# Altium integrated library Silica_IntLib.IntLib: 305 symbols (part 1 of 3) (continued)
## CI REG MCP16252 BOOST ADJ 100MA SOT23-6
designator U?, comment MCP16252T-I/CH
Switching Voltage Regulators; Manufacturer: Microchip; Manufacturer Part Number: MCP16252T-I/CH; Supplier 1: Mouser; Supplier Part Number 1: 579-MCP16252T-I/CH; Supplier Link 1: https://www.mouser.at/ProductDetail/Microchip-Technology/MCP16252T-I-CH?qs=sGAEpiMZZMtitjHzVIkrqbD93URdM9jft7YEhtTu2Rc%3d
footprint SOT23-6
pins: 1 SW, 2 GND, 3 EN, 4 VFB, 5 VOUT, 6 VIN

## CI REG MCP73831T-2ATI/OT SOT23-5
designator U?, comment MCP73831T-2ATI
Charger IC Lithium-Ion/Polymer SOT-23-5; VALUE: MCP73831T-2ATI/OT; Supplier 1: Digi-Key; Supplier 2: Farnell; Supplier 3: Digi-Key; Supplier 4: Allied; Supplier 5: Farnell; Supplier 6: Newark; Supplier 7: Newark; Supplier 8: Farnell; Supplier 9: Newark; Supplier 10: Farnell; Supplier 11: Digi-Key; Supplier Part Number 1: MCP73831T-2ATI/OTTR-ND; Supplier Part Number 2: 2413496; Supplier Part Number 3: MCP73831T-2ATI/OTCT-ND; Supplier Part Number 4: 70388655; Supplier Part Number 5: 1834890RL; Supplier Part Number 6: 84R5196; Supplier Part Number 7: 84R8632; Supplier Part Number 8: 2146142; Supplier Part Number 9: 56K7047; Supplier Part Number 10: 1834890; Supplier Part Number 11: MCP73831T-2ATI/OTDKR-ND
footprint SOT23-5
pins: 1 STAT, 2 GND, 3 VBAT, 4 VDD, 5 PROG

## CI REG NCP1117ST33T3G SOT223
designator U?, comment NCP1117ST33T3G
Linear Voltage Regulator IC Positive Fixed 1 Output  1A SOT-223; Manufacturer 1: ON Semiconductor; Supplier 1: Mouser; Supplier 2: Digi-Key; Supplier 3: Digi-Key; Supplier Part Number 1: 863-NCP1117ST33T3G; Supplier Part Number 2: NCP1117ST33T3GOSCT-ND; Supplier Part Number 3: NCP1117ST33T3GOSDKR-ND; VALUE: NCP1117ST33T3G; Manufacturer Part Number 1: NCP1117ST33T3G
footprint SOT-223 - 4 (SOT223, 4-Leads, Body 6,7x7,3mm (max), Pitch 2,30mm, IPC High Density)
pins: 1 GND, 2 VOUT, 3 VIN, 4 VOUT

## CI REG SP6203EM5-L-3-3 SOT23-5
designator U?, comment SP6203EM5-L-3-3
Linear Voltage Regulator IC Positive Fixed 1 Output  300mA SOT-23-5; Manufacturer 1: MaxLinear, Inc.; Supplier 1: Digi-Key; Supplier 2: Mouser; Supplier 3: Digi-Key; Supplier Part Number 1: 1016-1205-ND; Supplier Part Number 2: 701-SP6203EM5L33/TR; Supplier Part Number 3: SP6203EM5-L-3-3/TR-ND; Manufacturer Part Number 1: SP6203EM5-L-3-3; VALUE: SP6203EM5-L-3-3
footprint SOT23-5
pins: 1 VIN, 2 GND, 3 EN, 4 BYP, 5 VOUT

## CI REG SP6205EM5-L-3-3 SOT23-5
designator U?, comment SP6205EM5-L-3-3
Linear Voltage Regulator IC Positive Fixed 1 Output  500mA SOT-23-5; Manufacturer 1: MaxLinear, Inc.; Manufacturer Part Number 1: SP6205EM5-L-3-3/TR; Supplier 1: Mouser; Supplier 2: Mouser; Supplier 3: Digi-Key; Supplier Part Number 1: 701-SP6205EM5L33/TR; Supplier Part Number 2: 701-SP6205EM5-L-3-3; Supplier Part Number 3: 1016-1208-ND; VALUE: SP6205EM5-L-3-3
footprint SOT23-5
pins: 1 VIN, 2 GND, 3 EN, 4 BYP, 5 VOUT

## CI SN65HVD1781 SOIC-8
designator U?, comment SN65HVD1781
1/1 Transceiver Half RS422, RS485 8-SOIC; Manufacturer 1: Texas Instruments; Part Number 1: SN65HVD1781DR; Supplier 1: Farnell; Supplier 2: Newark; Supplier 3: Mouser; Supplier 4: Digi-Key; Supplier Part Number 1: 1703343; Supplier Part Number 2: 85M0100; Supplier Part Number 3: 595-SN65HVD1781DR; Supplier Part Number 4: 296-23118-1-ND; Value: SN65HVD1781
footprint SOIC-8N
pins: 1 R, 2 ~{RE}, 3 DE, 4 D, 5 GND, 6 A, 7 ~{B}, 8 VCC

## CI SN65HVD1785 SOIC-8
designator U?, comment SN65HVD1785
CI SN65HVD1785 SOIC-8; Supplier 1: Farnell; Supplier 2: Mouser; Supplier 3: Newark; Supplier 4: Digi-Key; Supplier 5: Digi-Key; Supplier Part Number 1: 1755057; Supplier Part Number 2: 595-SN65HVD1785DR; Supplier Part Number 3: 94M9570; Supplier Part Number 4: 296-39174-2-ND; Supplier Part Number 5: SN65HVD1785DRG4-ND; Value: SN65HVD1785
footprint SOIC-8N
pins: 1 R, 2 ~{RE}, 3 DE, 4 D, 5 GND, 6 A, 7 ~{B}, 8 VCC

## CI SN74LVC2T45 TSSOP8
designator U?, comment SN74LVC2T45DCTR
Voltage Level Translator Bidirectional 1 Circuit 2 Channel 420Mbps SM8 (SSOP); Manufacturer 1: Texas Instruments; Supplier 1: Farnell; Supplier 2: Digi-Key; Supplier 3: Newark; Supplier 4: Mouser; Supplier Part Number 1: 2412409; Supplier Part Number 2: 296-16845-2-ND; Supplier Part Number 3: 28X3899; Supplier Part Number 4: 595-SN74LVC2T45DCTE4; Part Number 1: SN74LVC2T45DCTR
footprint TSSOP8 (TSSOP, 8-Leads, Body 2.95x2.80mm, Pitch 0.65mm, IPC Medium Density)
pins: 1 VCCA, 2 A1, 3 A2, 4 GND, 5 DIR, 6 B2, 7 B1, 8 VCCB

## CI SST25VF010A-33 SOIC-8
designator U?, comment SST25VF010A
FLASH Memory IC 1Mb (128K x 8) SPI 33MHz  8-SOIC; Manufacturer Part Number 1: SST25VF010A-33-4I-SAE-T; Manufacturer 1: Microchip Technology; Value: SST25VF010A-33-4I-SAE; Supplier 1: Newark; Supplier 2: Farnell; Supplier 3: Digi-Key; Supplier 4: Mouser; Supplier Part Number 1: 54M1121; Supplier Part Number 2: 1829949; Supplier Part Number 3: SST25VF010A-33-4I-SAE-ND; Supplier Part Number 4: 804-25VF010A3ISAE
footprint SOIC-8N
pins: 1 ~{CE}, 2 SO, 3 ~{WP}, 4 VSS, 5 SI, 6 SCK, 7 ~{HOLD}, 8 VDD

## CI SWITCH TS3A4741DCNR DUAL SPST SOT23-8
designator U?, comment TS3A4741DCNR
2 Circuit IC Switch 1:1 900mOhm SOT-23-8; Manufacturer 1: Texas Instruments; VALUE: TS3A4741DCNR; Part Number 1: TS3A4741DCNR
footprint SOT23-8
part A pins: 1 IN, 7 COM, 8 NO
part B pins: 3 NO, 4 COM, 6 IN
part C pins: 2 VCC, 5 GND

## CI VREF SERIES 5V ADR02ARZ 8SOIC
designator U?, comment ADR02ARZ
Series Voltage Reference IC  ±0.1% 10mA 8-SOIC; Part Number 1: ADR02ARZ-REEL7; Manufacturer 1: Analog Devices Inc.; AD: ADR02ARZ
footprint SOIC-8N
pins: 1 NIC, 2 VIN, 3 TEMP, 4 GND, 5 TRIM, 6 VOUT, 7 NIC, 8 NIC

## CMC DLW21SN670HQ2L 320MA 2LN 67 OHM SMD
designator L?, comment DLW21SN670HQ2L
Common Mode Choke Coil Wire Wound Type; Supplier 1: Digi-Key; Supplier 2: Digi-Key; Supplier 3: Digi-Key; Supplier Part Number 1: 490-5133-6-ND; Supplier Part Number 2: 490-5133-1-ND; Supplier Part Number 3: 490-5133-2-ND
footprint SMD_DLW21S (DLW21S Series (0805 Size))
pins: 1, 2, 3, 4

## CMC DLW31SN900SQ2L 370MA 2LN 90 OHM SMD
designator L?, comment DLW31SN900SQ2L
2 Line Common Mode Choke Surface Mount 90 Ohm @ 100MHz 370mA DCR 300 mOhm; Manufacturer 1: Hirose Electric Co Ltd; Manufacturer Part Number 1: U.FL-R-SMT-1(01); Supplier 1: Digi-Key; Supplier 2: Digi-Key; Supplier 3: Digi-Key; Supplier 4: Mouser; Supplier 5: Arrow; Supplier Part Number 5: DLW31SN900SQ2L; Supplier Part Number 4: 81-DLW31SN900SQ2L; Supplier Part Number 3: 490-1067-2-ND; Supplier Part Number 2: 490-1067-6-ND; Supplier Part Number 1: 490-1067-1-ND; Value: DLW31SN900SQ2L
footprint SMD_DLW31S (DLW31S Series)
pins: 1, 2, 3, 4

## CONEC MCV 1,5_3-G-3,5 B
designator J?, comment MCV 1,5/ 3-G-3,5
3 Position Terminal Block Header, Male Pins, Shrouded (4 Side) 0.138" (3.50mm) Vertical  Through Hole; Manufacturer 1: Phoenix Contact; Manufacturer Part Number 1: 1843619; TYPE: MCV 1,5/ 3-G-3,5
footprint MCV 1,5_3-G-3,5
pins: 1, 2, 3

## CONEC MCV 1,5_3-G-3,81 B
designator J?  TYPE: MCV 1,5/ 3-G-3,81  (hidden comment: *)
MANUFACTURER: PHOENIX CONTACT; PN: 1803439; PACKING: B; PACKAGE: MCV 1,5/ 3-G-3,81; Supplier 1: Digi-Key; Supplier Part Number 1: 277-1222-ND
footprint MCV 1,5_3-G-3,81
footprint MCV 1,5_3-G-3,81 THR
pins: 1, 2, 3

## CONEC MCV 1,5_4-G-3,81 B
designator J?  TYPE: MCV 1,5/ 4-G-3,81  (hidden comment: *)
MANUFACTURER: PHOENIX CONTACT; PN: 1803442; PACKING: B; PACKAGE: MCV 1,5/ 4-G-3,81; Supplier 1: Digi-Key; Supplier Part Number 1: 277-1223-ND
footprint MCV 1,5_4-G-3,81
footprint MCV 1,5_4-G-3,81 THR
pins: 1, 2, 3, 4

## CONEC MCV 1,5_6-G-3,5 B
designator J?  TYPE: MCV 1,5/ 6-G-3,5  (hidden comment: *)
MANUFACTURER: PHOENIX CONTACT; PN: 1843648; PACKING: B; PACKAGE: MCV 1,5/ 6-G-3,5; Supplier 1: Mouser; Supplier Part Number 1: 651-1843648
footprint MCV 1,5_6-G-3,5
footprint MCV 1,5_6-G-3,5 THR
pins: 1, 2, 3, 4, 5, 6

## CONEC MCV 1,5_7-G-3,81AU B
designator J?  TYPE: MCV 1,5/ 7-G-3,81AU  (hidden comment: *)
MANUFACTURER: PHOENIX CONTACT; PN: 1939895; PACKING: B; PACKAGE: MCV 1,5/ 7-G-3,81AU
footprint MCV 1,5_7-G-3,81
pins: 1, 2, 3, 4, 5, 6, 7

## CONEC MSTB 2,5_2-G-5,08 B
designator J?  TYPE: MSTB 2,5/2-G-5,08  (hidden comment: *)
MANUFACTURER: PHOENIX CONTACT; PN: 1759017; PACKING: B; PACKAGE: MSTB 2,5/2-G-5,08; Supplier 1: Digi-Key; Supplier Part Number 1: 277-1095-ND
footprint MSTB 2,5_2-G-5,08 (Footprint not found)
pins: 1, 2

## CONEC SFMC-102-01-S-D  .050" X .050 CUTTABLE SKT STRIP
designator J?, comment SFMC-102-01-S-D
4 Position Receptacle Connector  Through Hole; Manufacturer 1: Samtec Inc.; VALUE: SFMC-102-01-S-D; Manufacturer Part Number 1: SFMC-102-01-S-D; Supplier 1: Digi-Key; Supplier 2: Farnell; Supplier 3: Mouser; Supplier 4: Arrow Electronics Inc.; Supplier 5: Newark; Supplier Part Number 1: SAM9900-ND; Supplier Part Number 2: 2779535; Supplier Part Number 3: 200-SFMC10201SD; Supplier Part Number 4: SFMC-102-01-S-D; Supplier Part Number 5: 33AC3092
footprint SFMC-102-01-S-D
pins: 1, 2, 3, 4

## CONECTOR BORNE 2 VIAS (5mm PASSO)
designator J?, comment KRE-2T  (value not drawn)
CONECTOR BORNE 2 VIAS (5mm PASSO); METALTEX: BR02A
footprint BR11 METALTEX
pins: 1, 2

## CONECTOR USB B P/PCI
designator J?, comment USB-BN  (value not drawn)
CONECTOR USB B P/PCI; METALTEX: USB-BN
pins: 1, 2, 3, 4, 5, 6
text: VBUS; D+; D-; SHIELD; GND

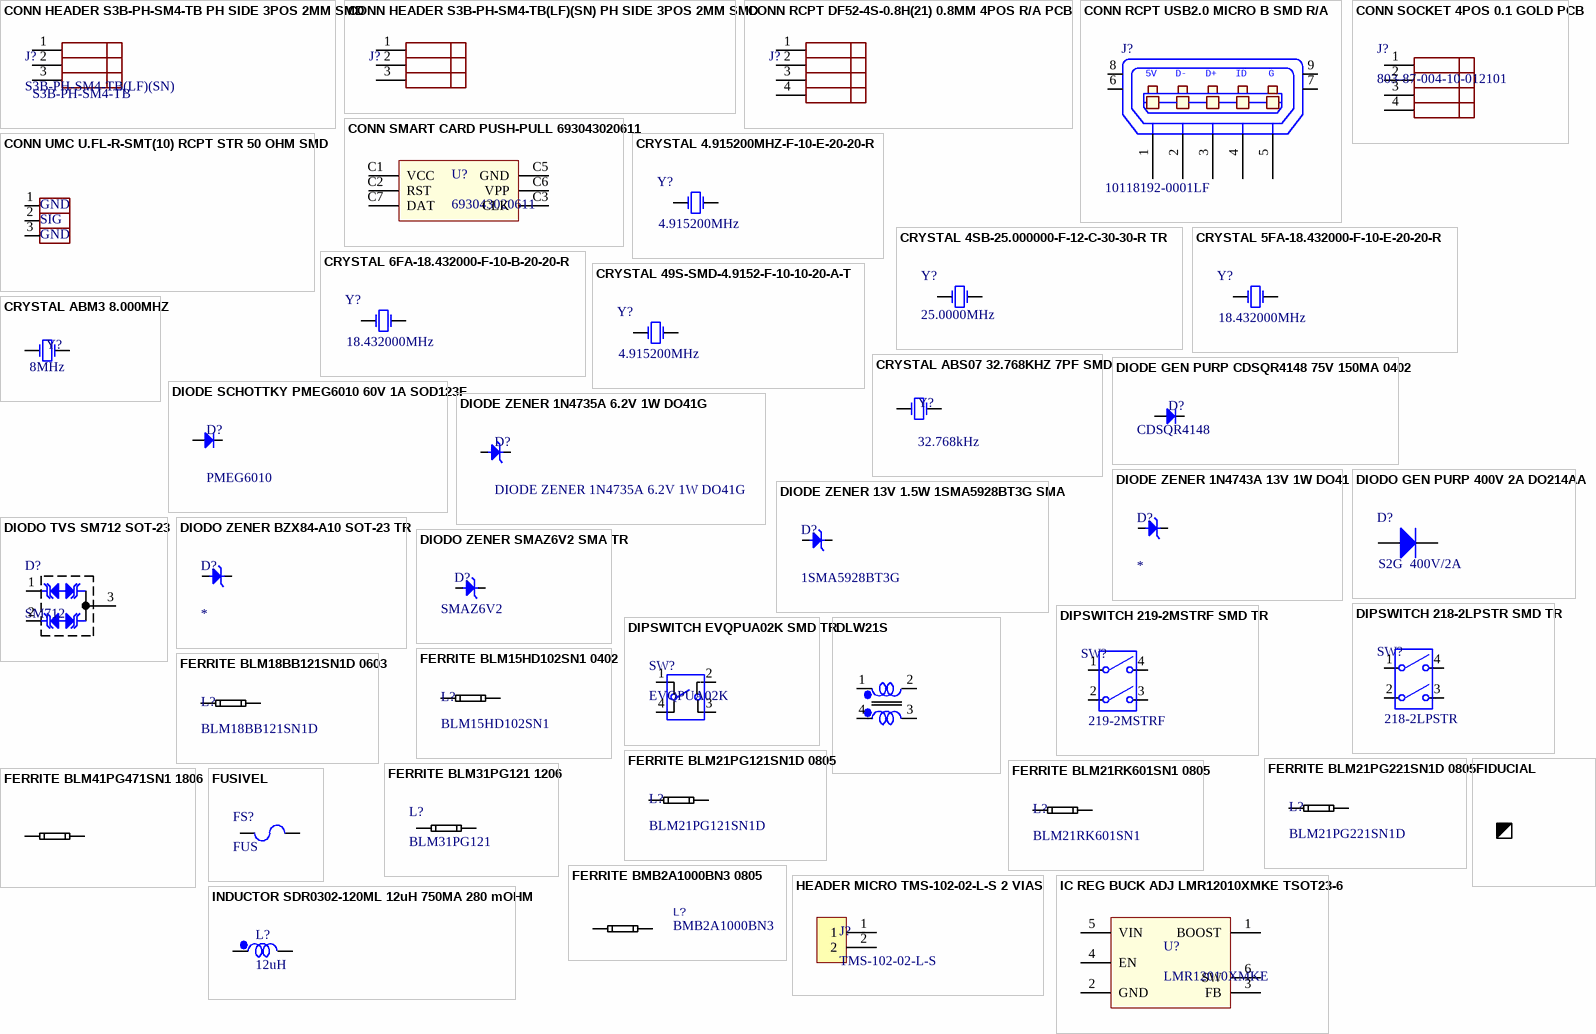
[diagram p3: symbols CONN HEADER S3B-PH-SM4-TB PH SIDE 3POS 2MM SMD to INDUCTOR SDR0302-120ML 12uH 750MA 280 mOHM]

## CONN HEADER S3B-PH-SM4-TB PH SIDE 3POS 2MM SMD
designator J?, comment S3B-PH-SM4-TB(LF)(SN)  value S3B-PH-SM4-TB
4 Position Socket Connector 0.031" (0.80mm) Surface Mount, Right Angle Tin; Supplier 1: Newark; Supplier 2: Farnell; Supplier 3: Digi-Key; Supplier 4: Digi-Key; Supplier 5: Digi-Key; Supplier 6: RSComponents; Supplier 7: RSComponents; Supplier 8: RSComponents; Supplier 9: Allied; Supplier 10: RSComponents; Supplier Part Number 1: 38K8071; Supplier Part Number 2: 9492623; Supplier Part Number 3: 455-1750-2-ND; Supplier Part Number 4: 455-1750-1-ND; Supplier Part Number 5: 455-1750-6-ND; Supplier Part Number 6: 688-1357P; Supplier Part Number 7: 688-1357; Supplier Part Number 8: 6881357; Supplier Part Number 9: R1044573; Supplier Part Number 10: 6881357P
footprint S3B-PH-SM4-TB (3 Positions Header Connector 0.079" (2.00mm) Surface Mount, Right Angle Tin)
pins: 1, 2, 3

## CONN HEADER S3B-PH-SM4-TB(LF)(SN) PH SIDE 3POS 2MM SMD
designator J?, comment S3B-PH-SM4-TB(LF)(SN)  (value not drawn)
Connector Header Surface Mount, Right Angle 3 position 0.079" (2.00mm); Manufacturer 1: JST Sales America Inc.; VALUE: S3B-PH-SM4-TB(LF)(SN); Manufacturer Part Number 1: S3B-PH-SM4-TB(LF)(SN); Supplier 1: Arrow Electronics Inc.; Supplier 2: Digi-Key; Supplier 3: Digi-Key; Supplier Part Number 3: 455-1750-1-ND; Supplier Part Number 2: 455-1750-2-ND; Supplier Part Number 1: S3B-PH-SM4-TB (LF)(SN)
footprint S3B-PH-SM4-TB (3 Positions Header Connector 0.079" (2.00mm) Surface Mount, Right Angle Tin)
pins: 1, 2, 3

## CONN RCPT DF52-4S-0.8H(21) 0.8MM 4POS R/A PCB
designator J?, comment DF52-4S-0.8H(21)  (value not drawn)
4 Position Socket Connector 0.031" (0.80mm) Surface Mount, Right Angle Tin; VALUE: DF52-4S-0.8H(21); Supplier 1: Digi-Key; Supplier 2: Digi-Key; Supplier 3: Digi-Key; Supplier Part Number 1: H125098TR-ND; Supplier Part Number 2: H125098CT-ND; Supplier Part Number 3: H125098DKR-ND
footprint DF52-4S-0.8H(21)
pins: 1, 2, 3, 4

## CONN RCPT USB2.0 MICRO B SMD R/A
designator J?, comment value 10118192-0001LF  (hidden comment: USB2.0 MICRO B)
USB - micro B USB 2.0 Receptacle Connector 5 Position Surface Mount, Right Angle; Manufacturer 1: Amphenol ICC (FCI); Manufacturer Part Number 1: 10118192-0001LF; Supplier 1: Mouser; Supplier Part Number 1: 649-10118192-0001LF
footprint USB_MICRO_AB
pins: 1 P1, 2 P2, 3 P3, 4 P4, 5 P5, 6, 7, 8, 9
text: 5V; D-; D+; ID; G

## CONN SMART CARD PUSH-PULL 693043020611
designator U?, comment 693043020611
6 Position Card Connector NANO SIM Surface Mount, Right Angle Gold; Manufacturer 1: Wurth Electronics Inc.; VALUE: 693043020611; Supplier 1: Farnell; Supplier 2: Newark; Supplier 3: Digi-Key; Supplier 4: Digi-Key; Supplier 5: Digi-Key; Supplier 6: Farnell; Supplier 7: Newark; Supplier Part Number 1: 2470827; Supplier Part Number 2: 46Y2832; Supplier Part Number 3: 732-5954-2-ND; Supplier Part Number 4: 732-5954-1-ND; Supplier Part Number 5: 732-5954-6-ND; Supplier Part Number 6: 2470836; Supplier Part Number 7: 52Y1273; Manufacturer Part Number 1: 693043020611
footprint 693043020611 (NANO SIM - PUSH & PULL TYPE - 6 PINS)
pins: C1 VCC, C2 RST, C3 CLK, C5 GND, C6 VPP, C7 DAT

## CONN SOCKET 4POS 0.1 GOLD PCB
designator J?, comment 803-87-004-10-012101
4 Position Socket Connector 0.100" (2.54mm) Through Hole Gold; Manufacturer 1: Preci-Dip; VALUE: 803-87-004-10-012101; Manufacturer Part Number 1: 803-87-004-10-012101
footprint 803-87-004-10-012101
pins: 1, 2, 3, 4

## CONN UMC U.FL-R-SMT(10) RCPT STR 50 OHM SMD
designator J?, comment U.FL-R-SMT(10)  Supplier Part Number 1: H122041-ND  Supplier Part Number 2: 798-UFLRSMT101
U.FL (UMCC) Connector Receptacle, Male Pin 50 Ohm Surface Mount Solder; Manufacturer 1: Hirose Electric Co Ltd; Manufacturer Part Number 1: U.FL-R-SMT-1(01); Value: U.FL-R-SMT-1(01); Supplier 1: Digi-Key; Supplier 2: Mouser
footprint U.FL-R-SMT
pins: 1 GND, 2 SIG, 3 GND

## CRYSTAL 4.915200MHZ-F-10-E-20-20-R
designator Y?  value 4.915200MHz  (hidden comment: CRYSTAL 4.915200MHZ-F-10-E-20-20-R)
MANUFACTURER: HOSONIC; ERPCODE: 0018369; PACKING: TR; PN: SB-4.915200-F-10-E-20-20-R; PACKAGE: SMD; TYPE: Cristal SMD
footprint HC-49SMA (SURFACE MOUNT CRYSTAL)
pins: 1 OSC1, 2 OSC2

## CRYSTAL 4SB-25.000000-F-12-C-30-30-R TR
designator Y?, comment 25.0000MHz
CRISTAL 4SB-25.000000-F-12-C-30-30-R TR
footprint HCX-4SB (Cristal de Quartzo em SMD)
pins: 1 OSC1, 3 OSC2

## CRYSTAL 5FA-18.432000-F-10-E-20-20-R
designator Y?  value 18.432000MHz  (hidden comment: CRYSTAL 5FA-18.432000-F-10-E-20-20-R)
MANUFACTURER: SHOULDER; ERPCODE: 0023370; PACKING: TR; PACKAGE: SMD; TYPE: Cristal SMD; PN: 5FA-18.432000-F-10-E-20-20-R
footprint HCX-5FA (SURFACE MOUNT CRYSTAL)
pins: 1 OSC1, 2 OSC2

## CRYSTAL 6FA-18.432000-F-10-B-20-20-R
designator Y?  value 18.432000MHz  (hidden comment: CRYSTAL 6FA-18.432000-F-10-B-20-20-R)
MANUFACTURER: HOSONIC; ERPCODE: 0018367; PACKING: TR; PACKAGE: SMD; TYPE: Cristal SMD; PN: 6FA-18.432000-F-10-B-20-20-R
footprint HCX-6FA (SURFACE MOUNT CRYSTAL)
pins: 1 OSC1, 2 OSC2

## CRYSTAL 49S-SMD-4.9152-F-10-10-20-A-T
designator Y?  value 4.915200MHz  (hidden comment: CRYSTAL 49S-SMD-4.9152-F-10-10-20-A-T)
MANUFACTURER: SHOULDER; ERPCODE: 0032009; PACKING: TR; PACKAGE: SMD; TYPE: Cristal SMD; PN: 49S-SMD-4.9152-F-10-10-20-A-T
footprint HC-49SB (LOW PROFILE HOLDER TYPE CRYSTAL UNITS)
pins: 1 OSC1, 2 OSC2

## CRYSTAL ABM3 8.000MHZ
designator Y?, comment 8MHz
8MHz ±20ppm Crystal 18pF 140 Ohm -40°C ~ 85°C Surface Mount 2-SMD, No Lead; Manufacturer 1: Abracon LLC; Manufacturer Part Number 1: ABM3-8.000MHZ-D2Y-T; Supplier 1: Digi-Key; Supplier 2: Farnell; Supplier 3: Farnell; Supplier 4: Digi-Key; Supplier 5: Newark; Supplier 6: Farnell; Supplier 7: Newark; Supplier 8: Digi-Key; Supplier 9: Farnell; Supplier 10: Newark; Supplier Part Number 1: 535-10630-2-ND; Supplier Part Number 2: 2367927; Supplier Part Number 3: 2101329RL; Supplier Part Number 4: 535-10630-1-ND; Supplier Part Number 5: 06X4672; Supplier Part Number 6: 2101329; Supplier Part Number 7: 76R7536; Supplier Part Number 8: 535-10630-6-ND; Supplier Part Number 9: 2101337; Supplier Part Number 10: 77R1485; VALUE: 8MHz
footprint ABM3 (MINIATURE CERAMIC SMD CRYSTAL)
pins: 1 OSC1, 2 OSC2

## CRYSTAL ABS07 32.768KHZ 7PF SMD
designator Y?, comment 32.768kHz
32.768kHz ±20ppm Crystal 7pF 70 kOhms 2-SMD, No Lead; Manufacturer 1: Abracon LLC; Manufacturer Part Number 1: ABS07-32.768KHZ-7-T; VALUE: 32.768kHz; Supplier 1: Digi-Key; Supplier 2: Digi-Key; Supplier 3: Digi-Key; Supplier 4: Future Electronics; Supplier 5: Future Electronics; Supplier 6: Farnell; Supplier 7: Farnell; Supplier 8: Mouser; Supplier 9: Avnet; Supplier 10: Arrow; Supplier 11: RSComponents; Supplier 12: RSComponents; Supplier 13: Avnet; Supplier 14: Avnet; Supplier 15: Newark; Supplier 16: Newark; Supplier 17: Newark; Supplier 18: Allied Electronics; Supplier 19: Arrow; Supplier 20: Avnet; Supplier 21: Avnet; Supplier 22: Farnell; Supplier 23: Future Electronics; Supplier 24: Future Electronics; Supplier 25: Future Electronics; Supplier Part Number 1: 535-9543-1-ND; Supplier Part Number 10: ABS07-32.768KHZ-7-T; Supplier Part Number 11: 1712773; Supplier Part Number 12: 1712307; Supplier Part Number 13: 14N8750; Supplier Part Number 14: 89M4970; Supplier Part Number 15: 14N8750; Supplier Part Number 16: 89M4970; Supplier Part Number 17: 25AC5632; Supplier Part Number 18: 71528070; Supplier Part Number 19: ABS07-32.768KHZ-7-T**MULT; Supplier Part Number 2: 535-9543-6-ND; Supplier Part Number 20: ABS07-32.768>>>; Supplier Part Number 21: ABS07-32.768KHZ-7-T/BKN; Supplier Part Number 22: 1838935RL; Supplier Part Number 23: ABS07-32.768KHZ-7-T; Supplier Part Number 9: ABS07-32.768KHZ-7-T; Supplier Part Number 8: 815-ABS07-32.768K7T; Supplier Part Number 7: 1833022; Supplier Part Number 6: 1838935; Supplier Part Number 5: ABS07-32.768KHZ-7-T-CUTT; Supplier Part Number 4: ABS07-32.768KHZ-7-T-REEL; Supplier Part Number 3: 535-9543-2-ND; Supplier Part Number 25: 6065130; Supplier Part Number 24: 8133308
footprint ABS07 (MINIATURE CERAMIC SMD CRYSTAL)
pins: 1 OSC1, 2 OSC2

## DIODE GEN PURP CDSQR4148 75V 150MA 0402
designator D?, comment CDSQR4148
Diode Standard 75V 150mA Surface Mount 0402/SOD-923F; Manufacturer 1: Comchip Technology; Manufacturer Part Number 1: CDSQR4148; Supplier 1: Digi-Key; Supplier 2: Digi-Key; Supplier 3: Digi-Key; Supplier 4: Mouser; Supplier 5: Arrow Electronics Inc.; Supplier 6: Allied Electronics; Supplier Part Number 6: 70426693; Supplier Part Number 5: CDSQR4148; Supplier Part Number 4: 750-CDSQR4148; Supplier Part Number 3: 641-1287-2-ND; Supplier Part Number 2: 641-1287-6-ND; Supplier Part Number 1: 641-1287-1-ND; VALUE: CDSQR4148
footprint SOD-923F
pins: 1 A, 2 K

## DIODE SCHOTTKY PMEG6010 60V 1A SOD123F
designator D?, comment PMEG6010
Diode Schottky 60V 1A (DC) Surface Mount SOD-123F; Manufacturer 1: Nexperia USA Inc.; Part Number 1: PMEG6010CEH,115; VALUE: PMEG6010
footprint SOD123F
pins: 1 A, 2 K

## DIODE ZENER 1N4735A 6.2V 1W DO41G
designator D?
Diodo Zener 6,2V / 1W; FARCHILD: 1N4735A; Supplier 1: Newark; Supplier 2: Digi-Key; Supplier 3: Allied; Supplier 4: Digi-Key; Supplier 5: Newark; Supplier 6: Farnell; Supplier 7: Newark; Supplier 8: Allied; Supplier 9: Farnell; Supplier 10: Digi-Key; Supplier 11: Farnell; Supplier 12: Farnell; Supplier 13: Farnell; Supplier 14: Newark; Supplier 15: Newark; Supplier 16: Farnell; Supplier 17: Digi-Key; Supplier 18: Digi-Key; Supplier 19: Digi-Key; Supplier 20: Digi-Key; Supplier 21: Farnell; Supplier 22: Newark; Supplier 23: Newark; Supplier 24: Newark; Supplier 25: Farnell; Supplier 26: Digi-Key; Supplier 27: Newark; Supplier 28: Newark; Supplier 29: Farnell; Supplier 30: Digi-Key; Supplier 31: Farnell; Supplier 32: Digi-Key; Supplier Part Number 1: 06M7371; Supplier Part Number 2: 1N4735A-TPTR-ND; Supplier Part Number 3: 70061975; Supplier Part Number 4: 1N4735AVSTR-ND; Supplier Part Number 5: 75R5240; Supplier Part Number 6: 1612364; Supplier Part Number 7: 18C8951; Supplier Part Number 8: 70061609; Supplier Part Number 9: 1504412; Supplier Part Number 10: 1N4735AVSCT-ND; Supplier Part Number 11: 2453286; Supplier Part Number 12: 4398786; Supplier Part Number 13: 1861449RL; Supplier Part Number 14: 95B4975; Supplier Part Number 15: 90R9422; Supplier Part Number 16: 2371129; Supplier Part Number 17: 1N4735AFS-ND; Supplier Part Number 18: 1N4735A_T50AFSCT-ND; Supplier Part Number 19: 1N4735A_T50AFSTB-ND; Supplier Part Number 20: 1727-4226-2-ND; Supplier Part Number 21: 1861449; Supplier Part Number 22: 33C2778; Supplier Part Number 23: 70R9667; Supplier Part Number 24: 29X4298; Supplier Part Number 25: 2164384; Supplier Part Number 26: 1N4735A-TPCT-ND; Supplier Part Number 27: 55R1226; Supplier Part Number 28: 33C7706; Supplier Part Number 29: 1383696; Supplier Part Number 30: 1N4735AFSTR-ND; Supplier Part Number 31: 1788232; Supplier Part Number 32: 1N4735AFSCT-ND
footprint DO-41
pins: A, K

## DIODE ZENER 1N4743A 13V 1W DO41
designator D?
Zener Diode 1W ±5% Through Hole DO-41; FARCHILD: 1N4743A; Supplier 1: Newark; Supplier 2: Newark; Supplier 3: Newark; Supplier 4: Digi-Key; Supplier 5: Digi-Key; Supplier 6: Allied; Supplier 7: Digi-Key; Supplier 8: Digi-Key; Supplier 9: Farnell; Supplier 10: Farnell; Supplier 11: Farnell; Supplier 12: Farnell; Supplier 13: Digi-Key; Supplier 14: Newark; Supplier 15: Allied; Supplier 16: Digi-Key; Supplier 17: Farnell; Supplier 18: Farnell; Supplier 19: Farnell; Supplier 20: Digi-Key; Supplier 21: Farnell; Supplier 22: Digi-Key; Supplier 23: Newark; Supplier 24: Newark; Supplier 25: Farnell; Supplier 26: Digi-Key; Supplier 27: Farnell; Supplier 28: Digi-Key; Supplier Part Number 1: 33C2791; Supplier Part Number 2: 90R9430; Supplier Part Number 3: 83C2541; Supplier Part Number 4: 1N4743AVSCT-ND; Supplier Part Number 5: 1034-1N4743ADITR-ND; Supplier Part Number 6: 70061982; Supplier Part Number 7: 1N4743AFSCT-ND; Supplier Part Number 8: 1034-1N4743ADIDKR-ND; Supplier Part Number 9: 1612406; Supplier Part Number 10: 2453731; Supplier Part Number 11: 9844082; Supplier Part Number 12: 2453731RL; Supplier Part Number 13: 1N4743AVSTR-ND; Supplier Part Number 14: 29X4306; Supplier Part Number 15: 70061617; Supplier Part Number 16: 1N4743A CT-ND; Supplier Part Number 17: 2127072; Supplier Part Number 18: 1577964; Supplier Part Number 19: 1621619; Supplier Part Number 20: 1N4743AFSTR-ND; Supplier Part Number 21: 2413234; Supplier Part Number 22: 1034-1N4743ADICT-ND; Supplier Part Number 23: 22H4343; Supplier Part Number 24: 31Y5540; Supplier Part Number 25: 5223738; Supplier Part Number 26: 1N4743A TR-ND; Supplier Part Number 27: 9558080; Supplier Part Number 28: 1N4743A-ND
footprint DO-41
pins: A, K

## DIODE ZENER 13V 1.5W 1SMA5928BT3G SMA
designator D?, comment 1SMA5928BT3G
Zener Diode 13V 1.5W ±5% Surface Mount SMA; Manufacturer 1: ON SEMICONDUCTOR; Supplier 1: Digi-Key; Supplier Part Number 1: 1SMA5928BT3GOSTR-ND; Part Number 1: 1SMA5928BT3G; Value: 1SMA5928BT3G
footprint SMA
pins: 1 K, 2 A

## DIODO GEN PURP 400V 2A DO214AA
designator D?, comment value S2G  400V/2A  (hidden comment: S2G)
Supplier 1: Digi-Key; Supplier 2: Digi-Key; Supplier 3: Mouser; Supplier 4: Digi-Key; Supplier 5: Digi-Key; Supplier 6: Digi-Key; Supplier 7: Digi-Key; Supplier 8: Digi-Key; Supplier 9: Digi-Key; Supplier 10: Digi-Key; Supplier 11: Digi-Key; Supplier Part Number 1: MURS140-E3/5BTGICT-ND; Supplier Part Number 2: ES2G-E3/52TGICT-ND; Supplier Part Number 3: 750-CGRB204-G; Supplier Part Number 4: S2GFSTR-ND; Supplier Part Number 5: MURS140-E3/52TGICT-ND; Supplier Part Number 6: S2GFSCT-ND; Supplier Part Number 7: MURS140-E3/5BTGITR-ND; Supplier Part Number 8: ES2G-E3/52TGITR-ND; Supplier Part Number 9: MURS140-E3/52TGIDKR-ND; Supplier Part Number 10: S2GFSDKR-ND; Supplier Part Number 11: MURS140-E3/52TGITR-ND
footprint DO-214AA
pins: 1 K, 2 A

## DIODO TVS SM712 SOT-23
designator D?, comment SM712
Asymmetrical TVS Diode for Extended Common-Mode RS-485; Manufacturer 1: Semtech Corporation; Part Number 1: SM712.TCT; VALUE: SM712
footprint SOT23-3 (SOT23, 3-Leads, Body 3,0x2,5mm (max), Pitch 0,83mm, IPC Medium Density)
pins: 1 IO1, 2 IO2, 3 COMMON

## DIODO ZENER BZX84-A10 SOT-23 TR
designator D?
DIODO ZENER BZX84-A10 SOT-23 TR; Supplier 1: Digi-Key; Supplier Part Number 1: 568-6802-2-ND
footprint SOT23-3 (SOT23, 3-Leads, Body 3,0x2,5mm (max), Pitch 0,83mm, IPC Medium Density)
pins: 1 A, 3 K

## DIODO ZENER SMAZ6V2 SMA TR
designator D?, comment SMAZ6V2
DIODO ZENER SMAZ6V2 SMA TR; Supplier 1: Mouser; Supplier 2: Newark; Supplier 3: Mouser; Supplier 4: Digi-Key; Supplier 5: Digi-Key; Supplier Part Number 1: 833-SMAZ6V2-TP; Supplier Part Number 2: 51T5000; Supplier Part Number 3: 621-SMAZ6V2-13-F; Supplier Part Number 4: SMAZ6V2-FDICT-ND; Supplier Part Number 5: SMAZ6V2-FDITR-ND; Value: SMAZ6V2
footprint SMA
pins: 1 K, 2 A
